# Altium footprint library B105connectors.PcbLib: 71 footprints (part 4 of 5)
Each footprint in its own frame and in the unit in brackets; x right, y up, seen from the top. Pads: shape width x height; smd on the part's side, far side on the other; paste and mask are expansions set on the pad; w line width, h text height; cw(c..) or ccw(c..) is an arc to the next point about the centre after c.
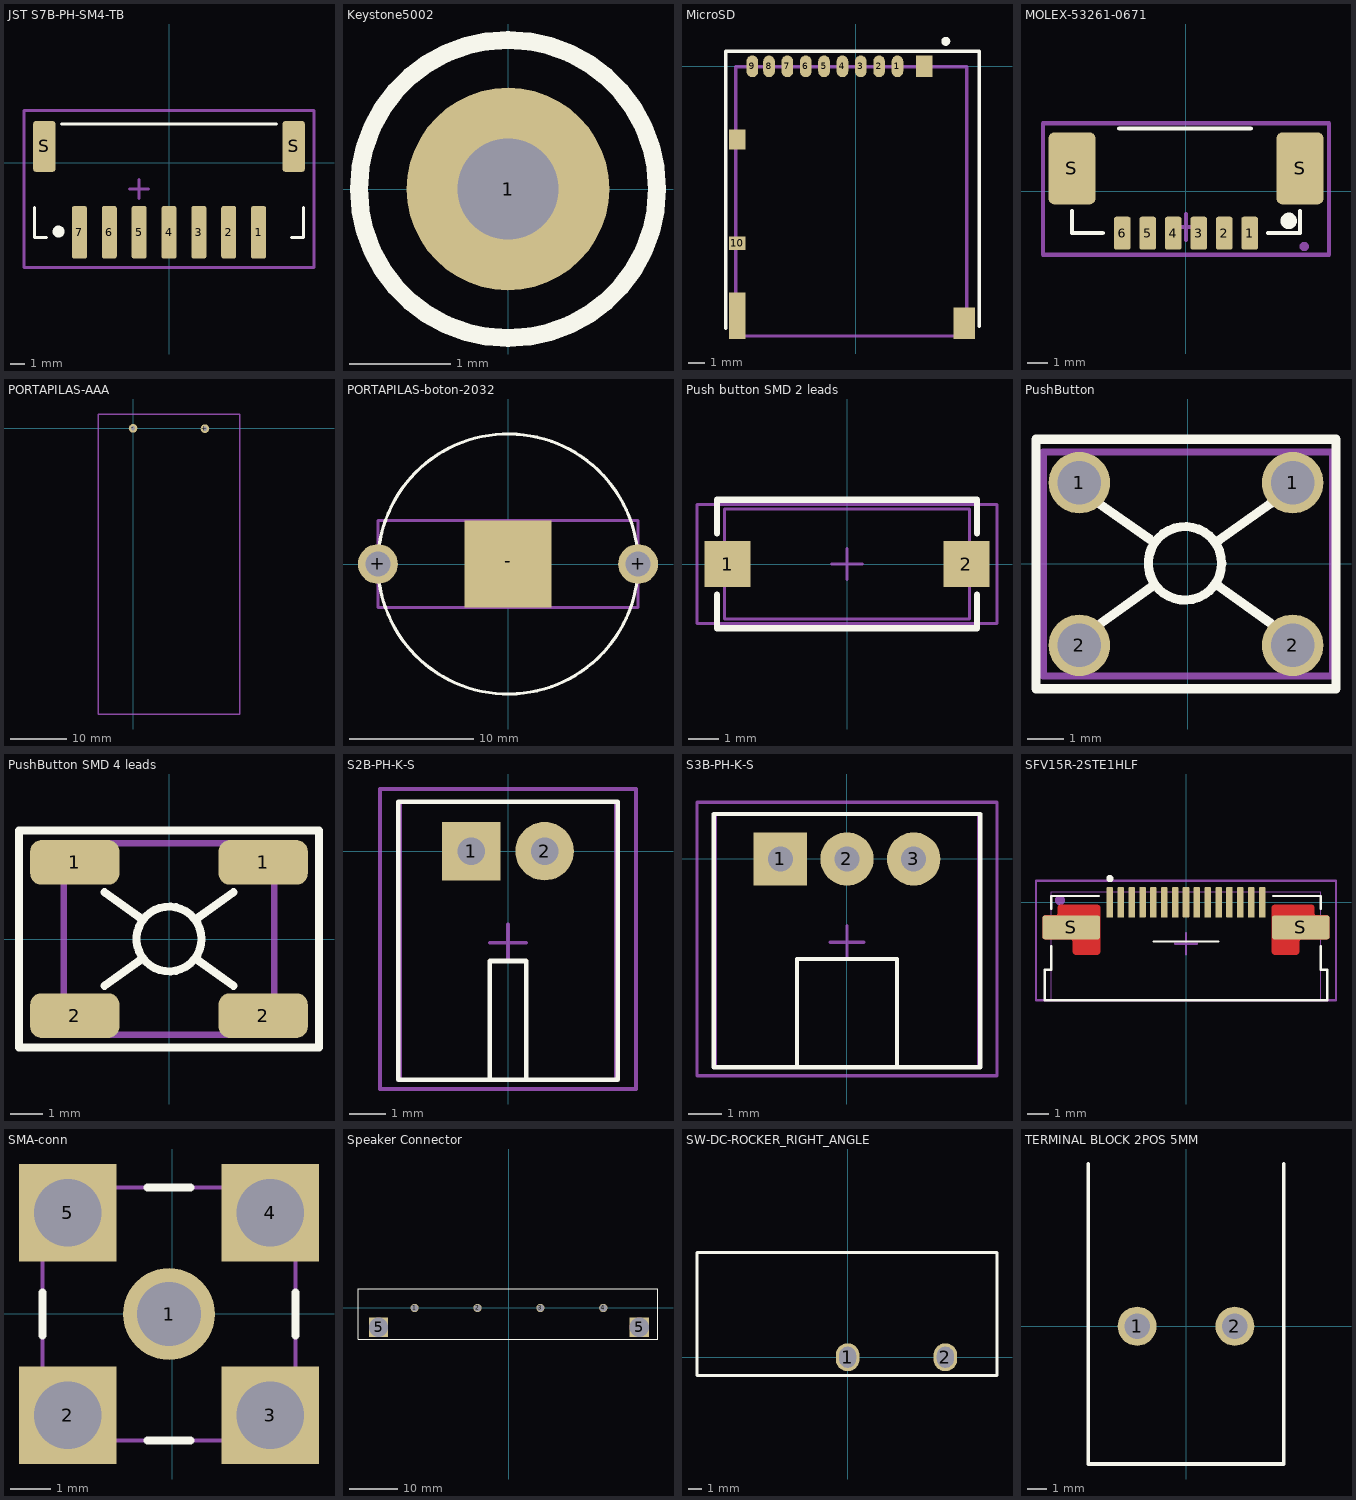
[diagram p3: the footprints below, top view; thin cyan lines are the x and y axes]

## JST S7B-PH-SM4-TB [mm]
pads (9):
  rrect25% 1x3.5 smd: 1(6,-4.65) 2(4,-4.65) 3(2,-4.65) 4(0,-4.65) 5(-2,-4.65) 6(-4,-4.65) 7(-6,-4.65)
  rrect25% 1.5x3.4 smd: S(-8.35,1.1) S(8.35,1.1)
Top Overlay:
  circle w0.4: c-7.4,-4.6 r0.2
  lines w0.2: -9,-2.975 -9,-5 -8.2,-5 ; -7.2,2.6 7.2,2.6 ; 8.2,-5 9,-5 9,-2.975
Mechanical 5:
  circle w0.254: c-7.4,-4.6 r0.1
Mechanical 15:
  lines w0.2: -2.635,-1.75 -1.365,-1.75 ; -2,-2.385 -2,-1.115 ; 9.699,-7 9.699,3.5 ; 9.7,-7 -9.699,-7 -9.699,3.5 9.7,3.5
3D body "S7B-PH-SM4-TB.STEP": height 5.5, standoff -0.1, extent -8.95,-6 8.95,2.6

## Keystone5002 [mm]
pads (1):
  round 2 hole 1: 1(0,0)
Top Overlay:
  circle w0.178: c0,0 r1.473
Mechanical 5:
  circle w0.127: c0,0 r1.481
  text ".Designator" at -1,-0.3 h0.6
Mechanical 15:
  circle w0.127: c0,0 r1.481
  lines w0.1: -0.3,0 0.3,0 ; 0,-0.3 0,0.3
3D body "Keystone_5002.stp": height 4.62, standoff -3, extent -1.245,-1.245 1.246,1.251

## MicroSD [mm]
pads (14):
  oval 0.7x1.3 smd: 1(2.5,0) 2(1.4,0) 3(0.3,0) 4(-0.8,0) 5(-1.9,0) 6(-3,0) 7(-4.1,0) 8(-5.2,0) 9(-6.2,0)
  rect 1x0.8 smd: 10(-7.1,-10.6)
  rect 1x2.8 smd: ""(-7.1,-14.95)
  rect 1x1.2 smd: ""(-7.1,-4.4)
  rect 1x1.3 smd: ""(4.1,0)
  rect 1.3x1.9 smd: ""(6.5,-15.4)
Top Overlay:
  circle w0.254: c5.4,1.5 r0.141
  lines w0.2: -7.8,-15.7 -7.8,0.3 -7.8,0.9 7.4,0.9 7.4,-15.6
Mechanical 13:
  lines w0.2: -7.19,-16.175 -7.19,-0.025 6.66,-0.025 6.66,-16.175 -7.19,-16.175
3D body "DM3AT-SF-PEJM5.STEP": height 1.68, standoff 0, extent -7.19,-16.175 6.66,-0.025

## MOLEX-53261-0671 [mm]
pads (8):
  rrect25% 0.8x1.6 smd: 1(3.1,-2.05) 2(1.86,-2.05) 3(0.62,-2.05) 4(-0.62,-2.05) 5(-1.86,-2.05) 6(-3.1,-2.05)
  rrect25% 2.3x3.5 smd: S(-5.55,1.1) S(5.55,1.1)
Top Overlay:
  circle w0.4: c5,-1.45 r0.2
  lines w0.2: -5.55,-0.975 -5.55,-2.05 -4.05,-2.05 ; -3.25,3.05 3.15,3.05 ; 4,-2.05 5.55,-2.05 5.55,-0.975
Mechanical 5:
  circle w0.254: c5.75,-2.7 r0.1
Mechanical 15:
  lines w0.2: -0.635,-1.75 0.635,-1.75 ; 0,-2.385 0,-1.115 ; -6.95,-3.1 6.95,-3.1 6.95,3.3 -6.95,3.3 -6.95,-3.1
3D body "molex 53261.step": height 3.5, standoff 0, extent -6.325,-2.35 6.325,2.85

## PORTAPILAS-AAA [mil]
pads (2):
  round 60 hole 30: +(500,-2) -(0,0)
Mechanical 1:
  lines w10: -242,-1986 742,-1986 742,100 -242,100 -242,-1986

## PORTAPILAS-boton-2032 [mm]
height 3.86
pads (3):
  round 3.2 hole 2.03: +(-10.45,0) +(10.45,0)
  rect 7x7 smd: -(0,0)
Top Overlay:
  circle w0.254: c0,0 r10.45
Mechanical 1:
  lines w0.254: -10.45,-3.5 10.45,-3.5 10.45,3.5 -10.4,3.5 -10.45,3.45 -10.45,-3.5
3D body "BC-2003.STEP": height 3.56, standoff 0, extent -12.7,-3.495 12.7,3.495

## Push button SMD 2 leads [mm]
height 2.5
pads (2):
  rect 1.5x1.5 smd: 1(-3.9,0) 2(3.9,0)
Top Overlay:
  lines w0.2: -4.25,-1 -4.25,-2.1 4.25,-2.1 4.25,-1 ; -4.25,1 -4.25,2.1 4.25,2.1 4.25,1
Mechanical 13:
  lines w0.1: -4,-1.8 -4,1.8 4,1.8 4,-1.8 -4,-1.8
Mechanical 15:
  lines w0.1: -0.5,0 0.5,0 ; 0,-0.5 0,0.5 ; -4.9,-1.95 -4.9,1.95 4.9,1.95 4.9,-1.95 -4.9,-1.95
3D body "Pushbutton_RS-282G05A3-SM RT.step": height 2.4, standoff -0.1, extent -4,-1.8 4,1.8

## PushButton [mm]
pads (4):
  round 1.7 hole 1.2: 1(-3,2.25) 1(2.9,2.25) 2(-3,-2.25) 2(2.9,-2.25)
Top Overlay:
  circle w0.254: c-0.079,0.018 r1.016
  lines w0.254: -2.492,1.694 -1.044,0.678 ; -2.467,-1.684 -1.019,-0.642 ; 0.861,-0.617 2.283,-1.633 ; 0.861,0.653 2.283,1.669 ; -4.2,-3.45 4.1,-3.45 4.1,3.45 -4.2,3.45 -4.2,-3.45
Mechanical 13:
  lines w0.2: -4,-3.1 -4,3.1 4,3.1 4,-3.1 -4,-3.1
3D body "Button.step": height 4, standoff -3.56, extent -3.96,-3.1 3.96,3.1

## PushButton SMD 4 leads [mm]
pads (4):
  rrect50% 2.8x1.4 smd: 1(-2.95,2.4) 1(2.95,2.4) 2(-2.95,-2.4) 2(2.95,-2.4)
Top Overlay:
  circle w0.254: c0,0 r1.016
  lines w0.254: -2.026,-1.464 -0.829,-0.609 ; -2.026,1.464 -0.829,0.609 ; 0.829,-0.609 2.026,-1.464 ; 0.829,0.609 2.026,1.464 ; -4.7,-3.4 -4.7,3.4 4.7,3.4 4.7,-3.4 -4.7,-3.4
Mechanical 13:
  lines w0.2: -3.3,-3 3.3,-3 3.3,3 -3.3,3 -3.3,-3
3D body "TL3301AFxxxxJ.stp": height 4.62, standoff -0.68, extent -3.3,-3 3.3,3

## S2B-PH-K-S [mm] "PH Connector 2mm pitch, side entry"
height 4.8
pads (2):
  rect 1.6x1.6 hole 0.75: 1(-1,0)
  round 1.6 hole 0.75: 2(1,0)
Top Overlay:
  lines w0.127: -0.5,-6.25 -0.5,-3 0.5,-3 0.5,-6.25 ; -3,-6.25 -3,-0.25 -3,1.35 ; -3,-6.25 -3,1.35 ; -3,-6.25 3,-6.25 3,1.35 -3,1.35
Mechanical 6:
  text ".Designator" at -1,-2.25 h0.76
Mechanical 13:
  lines w0.1: -0.5,-6.25 -0.5,-3 0.5,-3 0.5,-6.25 ; -2.95,-6.25 -2.95,1.35 2.95,1.35 2.95,-6.25 -2.95,-6.25
Mechanical 15:
  lines w0.1: -0.5,-2.5 0.5,-2.5 ; 0,-3 0,-2 ; -3.5,-6.5 -3.5,1.7 3.5,1.7 3.5,-6.5 -3.5,-6.5
3D body "S2B-PH-K-S.STEP": height 4.8, standoff -3.4, extent -2.95,-6.25 2.95,1.35

## S3B-PH-K-S [mm] "PH Connector 2mm pitch, side entry"
height 4.8
pads (3):
  rect 1.6x1.6 hole 0.75: 1(-2,0)
  round 1.6 hole 0.75: 2(0,0) 3(2,0)
Top Overlay:
  lines w0.127: -1.5,-6.25 -1.5,-3 1.5,-3 1.5,-6.25 ; -4,-6.25 4,-6.25 4,1.35 -4,1.35 ; -4,-6.25 -4,1.35 ; -4,-6.25 -4,-0.25 -4,1.35
Mechanical 6:
  text ".Designator" at -1,-2.25 h0.76
Mechanical 13:
  lines w0.1: -1.5,-6.25 -1.5,-3 1.5,-3 1.5,-6.25 ; -3.95,-6.25 3.95,-6.25 3.95,1.35 -3.95,1.35 -3.95,-6.25
Mechanical 15:
  lines w0.1: -0.5,-2.5 0.5,-2.5 ; 0,-3 0,-2 ; -4.5,-6.5 4.5,-6.5 4.5,1.7 -4.5,1.7 -4.5,-6.5
3D body "S3B-PH-K-S.STEP": height 4.8, standoff -3.4, extent -3.95,-6.25 3.95,1.35

## SFV15R-2STE1HLF [mm]
pads (17):
  rrect20% 0.3x1.4 smd: 1(-3.5,0) 2(-3,0) 3(-2.5,0) 4(-2,0) 5(-1.5,0) 6(-1,0) 7(-0.5,0) 8(0,0) 9(0.5,0) 10(1,0) 11(1.5,0) 12(2,0) 13(2.5,0) 14(3,0) 15(3.5,0)
  rrect20% 2.65x1.1 smd: S(-5.275,-1.15) S(5.275,-1.15)
Top Layer:
  region: -6.475,-1.7 -6.5,-1.7 -6.546,-1.681 -6.581,-1.646 -6.6,-1.6 -6.6,-1.575 -6.6,-0.725 -6.6,-0.7 -6.581,-0.654 -6.546,-0.619 -6.5,-0.6 -6.475,-0.6 -6.025,-0.6 -6.001,-0.598 -5.956,-0.579 -5.921,-0.544 -5.902,-0.499 -5.9,-0.475 -5.9,-0.225 -5.9,-0.2 -5.881,-0.154 -5.846,-0.119 -5.8,-0.1 -5.775,-0.1 -4.075,-0.1 -4.05,-0.1 -4.004,-0.119 -3.969,-0.154 -3.95,-0.2 -3.95,-0.225 -3.95,-2.275 -3.95,-2.3 -3.969,-2.346 -4.004,-2.381 -4.05,-2.4 -4.075,-2.4 -5.075,-2.4 -5.1,-2.4 -5.146,-2.381 -5.181,-2.346 -5.2,-2.3 -5.2,-2.275 -5.2,-1.825 -5.202,-1.801 -5.221,-1.756 -5.256,-1.721 -5.301,-1.702 -5.325,-1.7
  region: 6.475,-1.7 6.5,-1.7 6.546,-1.681 6.581,-1.646 6.6,-1.6 6.6,-1.575 6.6,-0.725 6.6,-0.7 6.581,-0.654 6.546,-0.619 6.5,-0.6 6.475,-0.6 6.025,-0.6 6.001,-0.598 5.956,-0.579 5.921,-0.544 5.902,-0.499 5.9,-0.475 5.9,-0.225 5.9,-0.2 5.881,-0.154 5.846,-0.119 5.8,-0.1 5.775,-0.1 4.075,-0.1 4.05,-0.1 4.004,-0.119 3.969,-0.154 3.95,-0.2 3.95,-0.225 3.95,-2.275 3.95,-2.3 3.969,-2.346 4.004,-2.381 4.05,-2.4 4.075,-2.4 5.075,-2.4 5.1,-2.4 5.146,-2.381 5.181,-2.346 5.2,-2.3 5.2,-2.275 5.2,-1.825 5.202,-1.801 5.221,-1.756 5.256,-1.721 5.301,-1.702 5.325,-1.7
Top Overlay:
  circle w0.254: c-3.5,1.1 r0.035
  lines w0.1: -6.2,-2 -6.2,-2.8 -6.2,-3.1 -6.5,-3.1 -6.5,-4.5 6.5,-4.5 6.5,-3.1 6.2,-3.1 6.2,-2.8 6.2,-2 ; -6.2,-0.3 -6.2,0.3 -4,0.3 ; -1.5,-1.8 1.5,-1.8 ; 4,0.3 6.2,0.3 6.2,-0.3
Mechanical 5:
  circle w0.254: c-5.8,0.1 r0.1
  lines w0.05: -6.2,-4.5 -6.2,0.5 6.2,0.5 6.2,-4.5 -6.2,-4.5
  text ".Designator" at 2,-1.1 h1.5
Mechanical 15:
  lines w0.1: -0.5,-1.9 0.5,-1.9 ; 0,-2.4 0,-1.4 ; -6.9,-4.5 -6.9,1 6.9,1 6.9,-4.5 -6.9,-4.5
3D body "ssfv15r_2stlf.stp": height 1.82, standoff -0.05, extent -6.5,-4.5 6.5,0.4

## SMA-conn [mm]
pads (5):
  round 2.3 hole 1.6: 1(-0.077,-0.006)
  rect 2.44x2.44 hole 1.7: 2(-2.617,-2.546) 3(2.463,-2.546) 4(2.463,2.534) 5(-2.617,2.534)
Top Overlay:
  lines w0.2: -3.252,-0.546 -3.252,0.534 ; -0.617,-3.181 0.463,-3.181 ; -0.617,3.169 0.463,3.169 ; 3.098,-0.546 3.098,0.534
Mechanical 13:
  lines w0.1: -3.252,-3.181 3.098,-3.181 3.098,3.169 -3.252,3.169 -3.252,-3.181
3D body "User Library-SMA_Stehend_Amp 132134RP-1.STEP": height 9.53, standoff -3.94, extent -3.577,-3.506 3.423,3.494

## Speaker Connector [mm]
pads (6):
  round 1.7 hole 1.5: 1(-19.5,0) 2(-6.5,0) 3(6.5,0) 4(19.5,0)
  rect 4x4 hole 4 square: 5(-26.95,-4) 5(26.95,-4)
Top Overlay:
  lines w0.2: -31.2,-6.5 -31.2,4 30.8,4 30.8,-6.5 -31.2,-6.5

## SW-DC-ROCKER_RIGHT_ANGLE [mm]
pads (2):
  oval 1.7x2 hole 1.2 slot 1.5 at 90 deg: 1(0,0) 2(7,0)
Top Overlay:
  lines w0.2: -10.8,-1.3 -10.8,7.5 10.7,7.5 10.7,-1.3 -10.8,-1.3
3D body "User Library-canal rocker switch mr2.step": height 14, standoff -6.1, extent -10.55,-0.6 10.45,21.27

## TERMINAL BLOCK 2POS 5MM [mm] "Terminal Block, 2Pos, 5mm pitch"
height 15.5
pads (2):
  round 2 hole 1.3: 1(-2.5,0) 2(2.5,0)
Top Overlay:
  lines w0.2: -5,8.3 -5,-7.05 5,-7.05 5,8.3
3D body "691132700002-rev1.stp": height 10.55, standoff -4.45, extent -5,-7.05 5,8.4